# Altium footprint library My Footprint 3D.PCBLIB: 447 footprints (part 10 of 29)
Each footprint in its own frame and in the unit in brackets; x right, y up, seen from the top. Pads: shape width x height; smd on the part's side, far side on the other; paste and mask are expansions set on the pad; w line width, h text height; cw(c..) or ccw(c..) is an arc to the next point about the centre after c.
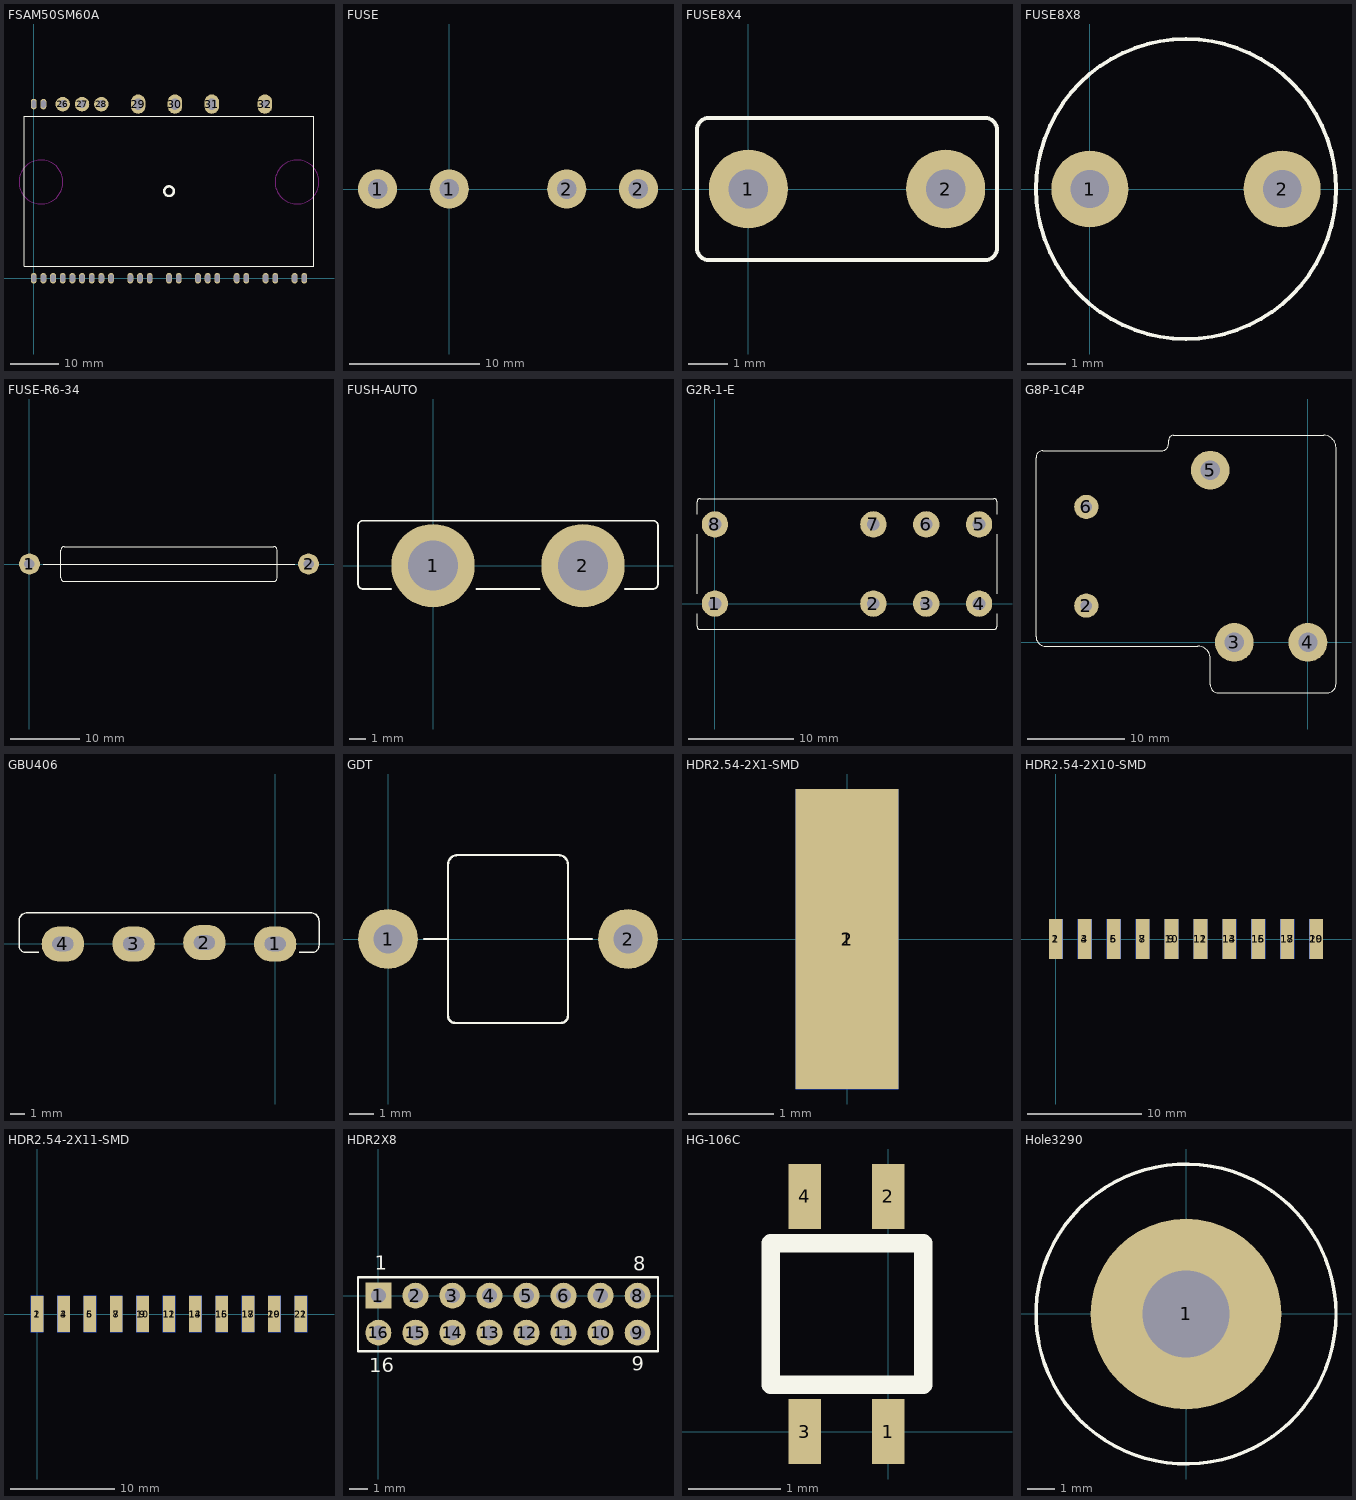
[diagram p9: the footprints below, top view; thin cyan lines are the x and y axes]

## FSAM50SM60A [mm]
pads (32):
  oval 1.2x2.2 hole 0.9 slot 1.5 at 90 deg: 1(0,0) 2(2,0) 3(4,0) 4(6,0) 5(8,0) 6(10,0) 7(12,0) 8(14,0) 9(16,0) 10(20,0) 11(22,0) 12(24,0) 13(28,0) 14(30,0) 15(34,0) 16(36,0) 17(38,0) 18(42,0) 19(44,0) 20(48,0) 21(50,0) 22(54,0) 23(56,0) 24(0,36.05) 25(2,36.05)
  round 3 hole 1.6: 26(6,36.05) 27(10,36.05) 28(14,36.05)
  oval 3x4 hole 1.6 slot 2.3 at 90 deg: 29(21.62,36.05) 30(29.24,36.05) 31(36.86,36.05)
  oval 3x4 hole 1.6: 32(47.86,36.05)
Top Overlay:
  circle w0.5: c28,18.025 r1
  lines w0.254: -2,2.525 -2,33.525 58,33.525 58,2.525 -2,2.525
Keep-Out Layer:
  circle w0.254: c54.5,19.925 r4.55
  circle w0.254: c1.5,19.925 r4.55

## FUSE [mm]
height 1.2
pads (4):
  round 3 hole 1.5: 1(-5.5,0) 1(0,0) 2(9,0) 2(14.5,0)
3D body: height 0.2, standoff -2, extent -5.7,-0.6 -5.3,0.6
3D body: height 0.2, standoff -2, extent -0.2,-0.6 0.2,0.6
3D body: height 0.2, standoff -2, extent 8.8,-0.6 9.2,0.6
3D body: height 0.2, standoff -2, extent 14.3,-0.6 14.7,0.6
3D body: height 0.2, standoff 0, extent -7,-3.5 1.5,3.5
3D body: height 10, standoff 0, extent -7,2 1.5,3.5
3D body: height 10, standoff 0, extent -7,-3.5 1.5,-2
3D body: height 10, standoff 0, extent 7.5,2 16,3.5
3D body: height 10, standoff 0, extent 7.5,-3.5 16,-2
3D body: height 9.3, standoff 4.7, extent -0.5,-2.2 9.5,2.382
3D body: height 9.5, standoff 4.5, extent -5.5,-2.399 -0.5,2.581
3D body: height 9.5, standoff 4.5, extent 9.5,-2.399 14.5,2.581
3D body: height 7.1, standoff 6.9, extent -2.6,-0.009 12.4,0.191
3D body: height 0.2, standoff 0, extent 7.5,-3.5 16,3.5

## FUSE8X4 [mm]
pads (2):
  round 2 hole 1: 1(0,0) 2(5,0)
Top Overlay:
  lines w0.1: -1.3,-1.5 ccw(c-1,-1.5) -1,-1.8 2.5,-1.8 6,-1.8 ccw(c6,-1.5) 6.3,-1.5 6.3,1.5 ccw(c6,1.5) 6,1.8 2.5,1.8 -1,1.8 ccw(c-1,1.5) -1.3,1.5 -1.3,-1.5
3D body: height 1, standoff -2, extent 4.693,-0.299 5.291,0.3
3D body: height 1, standoff -2, extent -0.298,-0.299 0.3,0.299
3D body: height 0.8, standoff 0, extent 1,-1.5 4,1.5
3D body: height 8, standoff 0.8, extent -1.6,-2.1 6.6,2.1
3D body: height 0.5, standoff -1.5, extent -0.406,-0.399 0.39,0.399
3D body: height 0.5, standoff -1.5, extent 4.594,-0.399 5.39,0.399

## FUSE8X8 [mm]
pads (2):
  round 2 hole 1: 1(0,0) 2(5,0)
Top Overlay:
  circle w0.1: c2.5,0 r3.9
3D body: height 0.5, standoff -1.5, extent 4.594,-0.399 5.39,0.399
3D body: height 0.5, standoff -1.5, extent -0.406,-0.399 0.39,0.399
3D body: height 8.5, standoff 0.5, extent -1.567,-4.092 6.6,4.092

## FUSE-R6-34 [mm]
pads (2):
  round 3 hole 1.5: 1(0,0) 2(40,0)
Top Overlay:
  lines w0.1: 2,0 38,0 ; 4.5,-2 ccw(c5,-2) 5,-2.5 35,-2.5 ccw(c35,-2) 35.5,-2 35.5,2 ccw(c35,2) 35,2.5 5,2.5 ccw(c5,2) 4.5,2 4.5,-2
3D body: height 6.67, standoff 0.3, extent 3.5,-3.194 10.5,3.194
3D body: height 6.87, standoff 0.1, extent 3.5,-3.393 7.5,3.393
3D body: height 4, standoff 3, extent -0.5,-0.499 3.5,0.499
3D body: height 3.5, standoff -2, extent -0.5,-0.499 0.496,0.499
3D body: height 3.5, standoff -2, extent 39.504,-0.499 40.5,0.499
3D body: height 4, standoff 3, extent 36.5,-0.499 40.5,0.499
3D body: height 6.87, standoff 0.1, extent 32.5,-3.393 36.5,3.393
3D body: height 6.67, standoff 0.3, extent 29.5,-3.194 36.5,3.194
3D body: height 6.28, standoff 0.7, extent 10.5,-2.794 29.5,2.794

## FUSH-AUTO [mm]
pads (2):
  round 5 hole 3: 1(0,0) 2(9,0)
Top Overlay:
  lines w0.1: -2.5,-1.4 -4.2,-1.4 cw(c-4.2,-1.1) -4.5,-1.1 -4.5,2.4 cw(c-4.2,2.4) -4.2,2.7 4.5,2.7 13.2,2.7 cw(c13.2,2.4) 13.5,2.4 13.5,-1.1 cw(c13.2,-1.1) 13.2,-1.4 11.5,-1.4 ; 2.6,-1.4 4.5,-1.4 6.4,-1.4
3D body: height 22, standoff 20, extent -4.9,-1.7 13.9,3.1
3D body: height 20, standoff 11, extent -4.9,-1 13.9,2.4
3D body: height 11, standoff 1, extent -2.501,0.8 2.501,1.299
3D body: height 11, standoff 1, extent -3.799,-1.299 -1.204,1.299
3D body: height 11, standoff 1, extent 1.201,-1.299 3.796,1.299
3D body: height 11, standoff 1, extent 6.499,0.8 11.501,1.299
3D body: height 11, standoff 1, extent 5.201,-1.299 7.796,1.299
3D body: height 11, standoff 1, extent 10.201,-1.299 12.796,1.299
3D body: height 1, standoff -2, extent -1.4,-1.3 1.4,1.2
3D body: height 1, standoff -2, extent 7.6,-1.25 10.4,1.25

## G2R-1-E [mm]
pads (8):
  round 2.5 / inner round 2.5 / far side round 3 hole 1.2: 1(0,0) 2(15,0) 3(20,0) 4(25,0) 5(25,7.5) 6(20,7.5) 7(15,7.5) 8(0,7.5)
Top Overlay:
  lines w0.1: -1.7,-0.95 -1.7,-2.15 ccw(c-1.4,-2.15) -1.4,-2.45 26.4,-2.45 ccw(c26.4,-2.15) 26.7,-2.15 26.7,-0.95 ; -1.7,0.95 -1.7,6.55 ; -1.7,8.45 -1.7,9.65 cw(c-1.4,9.65) -1.4,9.95 26.4,9.95 cw(c26.4,9.65) 26.7,9.65 26.7,8.45 ; 26.7,0.95 26.7,6.55
3D body: height 4, standoff 0.3, extent -2,-2.75 27,10.25
3D body: height 25.5, standoff 4, extent -2,-2.75 27,10.25

## G8P-1C4P [mm]
pads (5):
  round 2.5 hole 1.2: 2(-22.9,3.8) 6(-22.9,14)
  round 4 hole 2: 3(-7.6,0) 4(0,0) 5(-10.1,17.8)
Top Overlay:
  lines w0.1: -28.1,0.6 ccw(c-27.1,0.6) -27.1,-0.4 -11.37,-0.4 cw(c-11.37,-1.67) -10.1,-1.67 -10.1,-4.4 ccw(c-9.3,-4.4) -9.3,-5.2 2,-5.2 ccw(c2,-4.3) 2.9,-4.3 2.9,20.13 ccw(c1.63,20.13) 1.63,21.4 -6.5,21.4 -13.9,21.4 ccw(c-13.9,20.9) -14.4,20.9 -14.4,20.5 cw(c-15.1,20.5) -15.1,19.8 -27.4,19.8 ccw(c-27.4,19.1) -28.1,19.1 -28.1,0.6
3D body: height 20, standoff 0.4, extent -28.4,-5.5 3.2,21.7

## GBU406 [mm]
pads (4):
  oval 3x2.5 hole 1 slot 1.5 at 0 deg: 1(0,0) 2(-5,0.1) 3(-10,0) 4(-15,0)
Top Overlay:
  lines w0.1: -16.7,-0.6 -17.6,-0.6 cw(c-17.6,-0.1) -18.1,-0.1 -18.1,1.6 cw(c-17.5,1.6) -17.5,2.2 2.5,2.2 cw(c2.5,1.6) 3.1,1.6 3.1,-0.1 cw(c2.6,-0.1) 2.6,-0.6 1.7,-0.6
3D body: height 2.5, standoff 0, extent -16,-0.25 -14,0.25
3D body: height 2, standoff -2, extent -15.55,-0.25 -14.45,0.25
3D body: height 2.5, standoff 0, extent -6,-0.15 -4,0.35
3D body: height 2, standoff -2, extent -5.55,-0.15 -4.45,0.35
3D body: height 2.5, standoff 0, extent -1,-0.25 1,0.25
3D body: height 2, standoff -2, extent -0.55,-0.25 0.55,0.25
3D body: height 2.5, standoff 0, extent -11,-0.25 -9,0.25
3D body: height 2, standoff -2, extent -10.55,-0.25 -9.45,0.25
3D body: height 21, standoff 2.5, extent -18.5,-1.1 3.5,2.6

## GDT [mm]
pads (2):
  round 2.5 hole 1.2: 1(0,0) 2(10,0)
Top Overlay:
  lines w0.1: 1.5,0 2.5,0 ; 7.5,0 8.5,0 ; 2.5,-3.2 ccw(c2.8,-3.2) 2.8,-3.5 7.2,-3.5 ccw(c7.2,-3.2) 7.5,-3.2 7.5,3.1 ccw(c7.1,3.1) 7.1,3.5 6.1,3.5 2.9,3.5 ccw(c2.9,3.1) 2.5,3.1 2.5,-3.2
3D body: height 4.4, standoff 3.6, extent -0.4,-0.391 2,0.407
3D body: height 4, standoff -2, extent -0.4,-0.392 0.397,0.407
3D body: height 4, standoff -2, extent 9.603,-0.407 10.4,0.392
3D body: height 4.4, standoff 3.6, extent 8,-0.407 10.4,0.391
3D body: height 7.97, standoff 0, extent 2,-4 2.5,3.984
3D body: height 7.97, standoff 0, extent 7.5,-4 8,3.984
3D body: height 7.97, standoff 0, extent 2.5,-4 7.5,3.984

## HDR2.54-2X1-SMD [mm]
pads (2):
  rect 1.2x3.5 smd: 1(0,0)
  rect 1.2x3.5 smd far side: 2(0,0)

## HDR2.54-2X10-SMD [mm]
pads (20):
  rect 1.2x3.5 smd: 1(0,0) 3(2.54,0) 5(5.08,0) 7(7.62,0) 9(10.16,0) 11(12.7,0) 13(15.24,0) 15(17.78,0) 17(20.32,0) 19(22.86,0)
  rect 1.2x3.5 smd far side: 2(0,0) 4(2.54,0) 6(5.08,0) 8(7.62,0) 10(10.16,0) 12(12.7,0) 14(15.24,0) 16(17.78,0) 18(20.32,0) 20(22.86,0)

## HDR2.54-2X11-SMD [mm]
pads (22):
  rect 1.2x3.5 smd: 1(0,0) 3(2.54,0) 5(5.08,0) 7(7.62,0) 9(10.16,0) 11(12.7,0) 13(15.24,0) 15(17.78,0) 17(20.32,0) 19(22.86,0) 21(25.4,0)
  rect 1.2x3.5 smd far side: 2(0,0) 4(2.54,0) 6(5.08,0) 8(7.62,0) 10(10.16,0) 12(12.7,0) 14(15.24,0) 16(17.78,0) 18(20.32,0) 20(22.86,0) 22(25.4,0)

## HDR2X8 [mm] "Distance 2mm"
height 8
pads (16):
  rect 1.4x1.4 hole 0.8: 1(0,0)
  round 1.4 hole 0.8: 2(2,0) 3(4,0) 4(6,0) 5(8,0) 6(10,0) 7(12,0) 8(14,0) 9(14,-2) 10(12,-2) 11(10,-2) 12(8,-2) 13(6,-2) 14(4,-2) 15(2,-2) 16(0,-2)
Top Overlay:
  lines w0.127: -1.1,-3 15.1,-3 15.1,1 -1.1,1 -1.1,-3
  text "9" at 13.691,-4.064 h0.76
  text "8" at 13.767,1.346 h0.76
  text "16" at -0.483,-4.14 h0.76
  text "1" at -0.203,1.397 h0.76

## HG-106C [mm]
pads (4):
  rect 0.35x0.7 smd: 1(0,0) 2(0,2.54) 3(-0.9,0) 4(-0.9,2.54)
Top Overlay:
  lines w0.2: -1.27,0.508 0.381,0.508 0.381,2.032 -1.27,2.032 -1.27,0.508

## Hole3290 [mm]
pads (1):
  round 7 hole 3.2: 1(0,0)
Top Overlay:
  circle w0.127: c0,0 r5.5